# Altium footprint library IC.PcbLib: 68 footprints (part 1 of 5)
Each footprint in its own frame and in the unit in brackets; x right, y up, seen from the top. Pads: shape width x height; smd on the part's side, far side on the other; paste and mask are expansions set on the pad; w line width, h text height; cw(c..) or ccw(c..) is an arc to the next point about the centre after c.
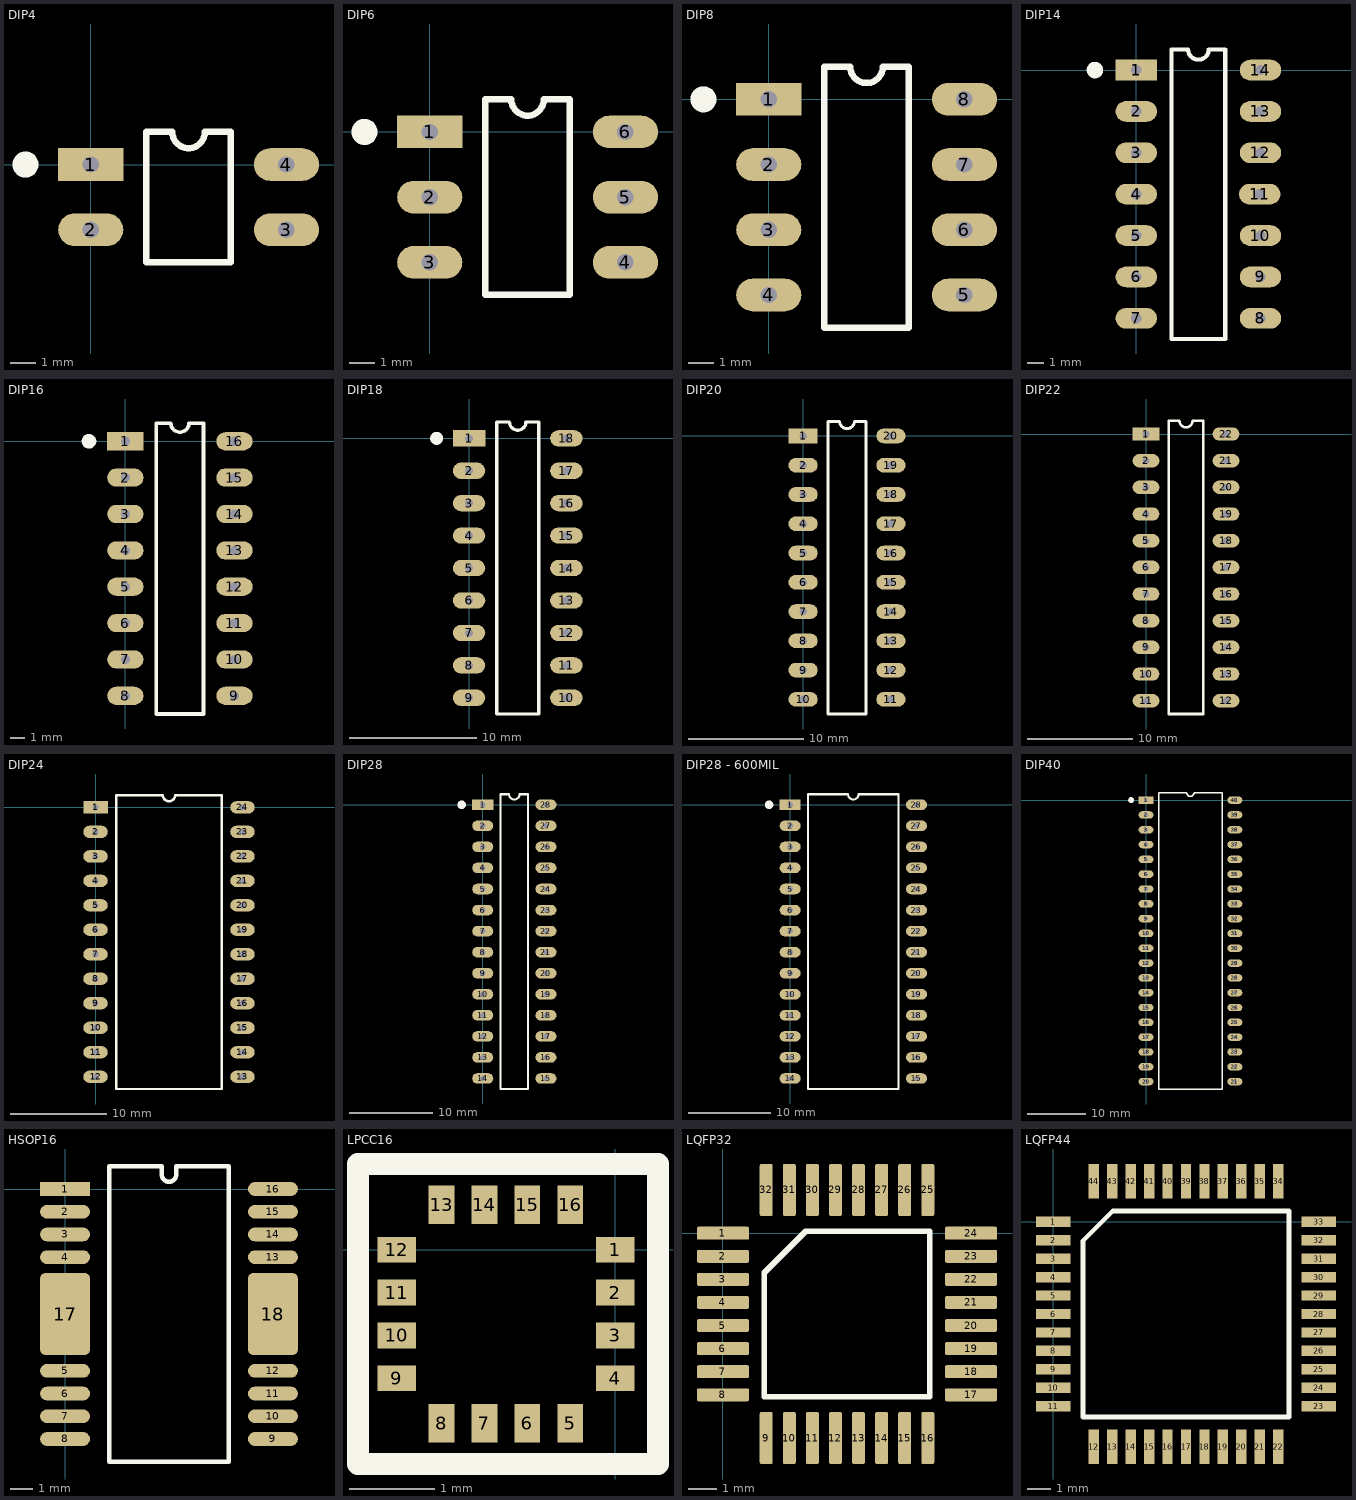
[diagram p0: the footprints below, top view; thin cyan lines are the x and y axes]

## DIP4 [mm]
pads (4):
  rect 2.54x1.27 hole 0.635: 1(0,0)
  oval 2.54x1.27 hole 0.635: 2(0,-2.54) 3(7.62,-2.54) 4(7.62,0)
Top Overlay:
  circle w0.508: c-2.54,0 r0.254
  lines w0.254: 2.159,-3.81 2.159,1.27 3.175,1.27 ccw(c3.81,1.27) 4.445,1.27 5.461,1.27 5.461,-3.81 2.159,-3.81
3D body "CircuitWorks-DIP4.step": height 4.31, standoff -3.28, extent 0,-4.04 8,1.5

## DIP6 [mm]
pads (6):
  rect 2.54x1.27 hole 0.635: 1(0,0)
  oval 2.54x1.27 hole 0.635: 2(0,-2.54) 3(0,-5.08) 4(7.62,-5.08) 5(7.62,-2.54) 6(7.62,0)
Top Overlay:
  circle w0.508: c-2.54,0 r0.254
  lines w0.254: 2.159,-6.35 5.461,-6.35 5.461,1.27 4.445,1.27 cw(c3.81,1.27) 3.175,1.27 2.159,1.27 2.159,-6.35
3D body "User Library-DIP06-300.step": height 5.3, standoff -2.49, extent -0.13,-6.94 7.75,1.86

## DIP8 [mm]
pads (8):
  rect 2.54x1.27 hole 0.635: 1(0,0)
  oval 2.54x1.27 hole 0.635: 2(0,-2.54) 3(0,-5.08) 4(0,-7.62) 5(7.62,-7.62) 6(7.62,-5.08) 7(7.62,-2.54) 8(7.62,0)
Top Overlay:
  circle w0.508: c-2.54,0 r0.254
  lines w0.254: 2.159,-8.89 5.461,-8.89 5.461,1.27 4.445,1.27 cw(c3.81,1.27) 3.175,1.27 2.159,1.27 2.159,-8.89
3D body "User Library-DIP08-300.step": height 5.08, standoff -2.49, extent -0.125,-9.27 7.745,1.65

## DIP14 [mil]
pads (14):
  rect 100x50 hole 25: 1(0,0)
  oval 100x50 hole 25: 2(0,-100) 3(0,-200) 4(0,-300) 5(0,-400) 6(0,-500) 7(0,-600) 8(300,-600) 9(300,-500) 10(300,-400) 11(298,-300) 12(300,-200) 13(300,-100) 14(300,0)
Top Overlay:
  circle w20: c-100,0 r10
  lines w10: 85,-650 215,-650 215,50 175,50 cw(c150,50) 125,50 85,50 85,-650
3D body "User Library-DIP14-300.step": height 200, standoff -98.03, extent -11.84,-683.86 298,83.86

## DIP16 [mm] "DIP; 16 Leads; Row Spacing 7.62mm; Pitch 2.54mm"
pads (16):
  rect 2.54x1.27 hole 0.635: 1(0,0)
  oval 2.54x1.27 hole 0.635: 2(0,-2.54) 3(0,-5.08) 4(0,-7.62) 5(0,-10.16) 6(0,-12.7) 7(0,-15.24) 8(0,-17.78) 9(7.62,-17.78) 10(7.62,-15.24) 11(7.62,-12.7) 12(7.62,-10.16) 13(7.62,-7.62) 14(7.62,-5.08) 15(7.62,-2.54) 16(7.62,0)
Top Overlay:
  circle w0.508: c-2.54,0 r0.254
  lines w0.254: 2.159,-19.05 5.461,-19.05 5.461,1.27 4.445,1.27 cw(c3.81,1.27) 3.175,1.27 2.159,1.27 2.159,-19.05
3D body "User Library-DIP16-300.step": height 5.08, standoff -2.49, extent -0.125,-18.89 7.745,1.11

## DIP18 [mm]
pads (18):
  rect 2.54x1.27 hole 0.635: 1(0,0)
  oval 2.54x1.27 hole 0.635: 2(0,-2.54) 3(0,-5.08) 4(0,-7.62) 5(0,-10.16) 6(0,-12.7) 7(0,-15.24) 8(0,-17.78) 9(0,-20.32) 10(7.62,-20.32) 11(7.62,-17.78) 12(7.62,-15.24) 13(7.62,-12.7) 14(7.62,-10.16) 15(7.62,-7.62) 16(7.62,-5.08) 17(7.62,-2.54) 18(7.62,0)
Top Overlay:
  circle w0.508: c-2.54,0 r0.254
  lines w0.254: 2.159,-21.59 2.159,1.27 3.175,1.27 ccw(c3.81,1.27) 4.445,1.27 5.461,1.27 5.461,-21.59 2.159,-21.59
3D body "User Library-DIP18-300.step": height 5.08, standoff -2.49, extent -0.125,-21.72 7.745,1.27

## DIP20 [mm]
pads (20):
  rect 2.54x1.27 hole 0.635: 1(0,0)
  oval 2.54x1.27 hole 0.635: 2(0,-2.54) 3(0,-5.08) 4(0,-7.62) 5(0,-10.16) 6(0,-12.7) 7(0,-15.24) 8(0,-17.78) 9(0,-20.32) 10(0,-22.86) 11(7.62,-22.86) 12(7.62,-20.32) 13(7.62,-17.78) 14(7.62,-15.24) 15(7.62,-12.7) 16(7.62,-10.16) 17(7.62,-7.62) 18(7.62,-5.08) 19(7.62,-2.54) 20(7.62,0)
Top Overlay:
  lines w0.254: 2.159,-24.13 2.159,1.27 3.175,1.27 ccw(c3.81,1.27) 4.445,1.27 5.461,1.27 5.461,-24.13 2.159,-24.13
3D body "User Library-DIP20.STEP": height 4.57, standoff -3.81, extent -0.1,-24.7 7.72,1.84

## DIP22 [mm]
pads (22):
  rect 2.54x1.27 hole 0.635: 1(0,0)
  oval 2.54x1.27 hole 0.635: 2(0,-2.54) 3(0,-5.08) 4(0,-7.62) 5(0,-10.16) 6(0,-12.7) 7(0,-15.24) 8(0,-17.78) 9(0,-20.32) 10(0,-22.86) 11(0,-25.4) 12(7.62,-25.4) 13(7.62,-22.86) 14(7.62,-20.32) 15(7.62,-17.78) 16(7.62,-15.24) 17(7.62,-12.7) 18(7.62,-10.16) 19(7.62,-7.62) 20(7.62,-5.08) 21(7.62,-2.54) 22(7.62,0)
Top Overlay:
  lines w0.254: 2.159,-26.67 2.159,1.27 3.175,1.27 ccw(c3.81,1.27) 4.445,1.27 5.461,1.27 5.461,-26.67 2.159,-26.67
3D body "User Library-DIP22P3.STEP": height 5.09, standoff -2.48, extent -0.125,-27.53 7.745,2.13

## DIP24 [mm]
pads (24):
  rect 2.54x1.27 hole 0.635: 1(0,0)
  oval 2.54x1.27 hole 0.635: 2(0,-2.54) 3(0,-5.08) 4(0,-7.62) 5(0,-10.16) 6(0,-12.7) 7(0,-15.24) 8(0,-17.78) 9(0,-20.32) 10(0,-22.86) 11(0,-25.4) 12(0,-27.94) 13(15.24,-27.94) 14(15.24,-25.4) 15(15.24,-22.86) 16(15.24,-20.32) 17(15.24,-17.78) 18(15.24,-15.24) 19(15.24,-12.7) 20(15.24,-10.16) 21(15.24,-7.62) 22(15.24,-5.08) 23(15.24,-2.54) 24(15.24,0)
Top Overlay:
  lines w0.254: 2.159,-29.21 13.081,-29.21 13.081,1.27 8.255,1.27 cw(c7.62,1.27) 6.985,1.27 2.159,1.27 2.159,-29.21
3D body "User Library-DIP24-600.step": height 5.7, standoff -2.58, extent -0.125,-30.1 15.365,2.16

## DIP28 [mm]
pads (28):
  rect 2.54x1.27 hole 0.635: 1(0,0)
  oval 2.54x1.27 hole 0.635: 2(0,-2.54) 3(0,-5.08) 4(0,-7.62) 5(0,-10.16) 6(0,-12.7) 7(0,-15.24) 8(0,-17.78) 9(0,-20.32) 10(0,-22.86) 11(0,-25.4) 12(0,-27.94) 13(0,-30.48) 14(0,-33.02) 15(7.62,-33.02) 16(7.62,-30.48) 17(7.62,-27.94) 18(7.62,-25.4) 19(7.62,-22.86) 20(7.62,-20.32) 21(7.62,-17.78) 22(7.62,-15.24) 23(7.62,-12.7) 24(7.62,-10.16) 25(7.62,-7.62) 26(7.62,-5.08) 27(7.62,-2.54) 28(7.62,0)
Top Overlay:
  circle w0.508: c-2.54,0 r0.254
  lines w0.254: 2.159,-34.29 5.461,-34.29 5.461,1.27 4.445,1.27 cw(c3.81,1.27) 3.175,1.27 2.159,1.27 2.159,-34.29
3D body "User Library-DIP28-300 (1).step": height 5.08, standoff -2.49, extent -0.125,-34.51 7.745,1.49

## DIP28 - 600MIL [mm]
pads (28):
  rect 2.54x1.27 hole 0.635: 1(0,0)
  oval 2.54x1.27 hole 0.635: 2(0,-2.54) 3(0,-5.08) 4(0,-7.62) 5(0,-10.16) 6(0,-12.7) 7(0,-15.24) 8(0,-17.78) 9(0,-20.32) 10(0,-22.86) 11(0,-25.4) 12(0,-27.94) 13(0,-30.48) 14(0,-33.02) 15(15.24,-33.02) 16(15.24,-30.48) 17(15.24,-27.94) 18(15.24,-25.4) 19(15.24,-22.86) 20(15.24,-20.32) 21(15.24,-17.78) 22(15.24,-15.24) 23(15.24,-12.7) 24(15.24,-10.16) 25(15.24,-7.62) 26(15.24,-5.08) 27(15.24,-2.54) 28(15.24,0)
Top Overlay:
  circle w0.508: c-2.54,0 r0.254
  lines w0.254: 13.056,1.27 8.255,1.27 cw(c7.62,1.27) 6.985,1.27 2.159,1.27 2.159,-34.29 13.081,-34.29 13.081,1.295
3D body "User Library-DIP28-600.step": height 5.7, standoff -2.58, extent -0.125,-35.16 15.365,2.14

## DIP40 [mm]
pads (40):
  rect 2.54x1.27 hole 0.635: 1(0,0)
  oval 2.54x1.27 hole 0.635: 2(0,-2.54) 3(0,-5.08) 4(0,-7.62) 5(0,-10.16) 6(0,-12.7) 7(0,-15.24) 8(0,-17.78) 9(0,-20.32) 10(0,-22.86) 11(0,-25.4) 12(0,-27.94) 13(0,-30.48) 14(0,-33.02) 15(0,-35.56) 16(0,-38.1) 17(0,-40.64) 18(0,-43.18) 19(0,-45.72) 20(0,-48.26) 21(15.24,-48.26) 22(15.24,-45.72) 23(15.24,-43.18) 24(15.24,-40.64) 25(15.24,-38.1) 26(15.24,-35.56) 27(15.24,-33.02) 28(15.24,-30.48) 29(15.24,-27.94) 30(15.24,-25.4) 31(15.24,-22.86) 32(15.24,-20.32) 33(15.24,-17.78) 34(15.24,-15.24) 35(15.24,-12.7) 36(15.24,-10.16) 37(15.24,-7.62) 38(15.24,-5.08) 39(15.24,-2.54) 40(15.24,0)
Top Overlay:
  circle w0.508: c-2.54,0 r0.254
  lines w0.254: 2.159,-49.53 2.159,1.27 6.985,1.27 ccw(c7.62,1.27) 8.255,1.27 13.081,1.27 13.081,-49.53 2.159,-49.53
3D body "User Library-DIP40-600.step": height 5.7, standoff -2.58, extent -0.152,-50.368 15.338,2.082

## HSOP16 [mm]
pads (18):
  rect 2.2x0.6 smd: 1(0,0)
  oval 2.2x0.6 smd: 2(0,-1) 3(0,-2) 4(0,-3) 5(0,-8) 6(0,-9) 7(0,-10) 8(0,-11) 9(9.144,-11) 10(9.144,-10) 11(9.144,-9) 12(9.144,-8) 13(9.144,-3) 14(9.144,-2) 15(9.144,-1) 16(9.144,0)
  rrect20% 2.2x3.6 smd: 17(0,-5.5) 18(9.144,-5.5)
Top Overlay:
  lines w0.2: 1.935,-12 1.935,1 4.255,1 4.255,0.635 ccw(c4.572,0.635) 4.889,0.635 4.889,1 7.209,1 7.209,-12 1.935,-12
3D body "User Library-HSOP16-TB6569FG.step": height 2.4, standoff 0, extent -0.3,-12 9.3,1

## LPCC16 [mm]
pads (16):
  rect 0.45x0.3 smd: 1(0,0) 2(0,-0.5) 3(0,-1) 4(0,-1.5) 9(-2.55,-1.5) 10(-2.55,-1) 11(-2.55,-0.5) 12(-2.55,0)
  rect 0.3x0.45 smd: 5(-0.525,-2.025) 6(-1.025,-2.025) 7(-1.525,-2.025) 8(-2.025,-2.025) 13(-2.025,0.525) 14(-1.525,0.525) 15(-1.025,0.525) 16(-0.525,0.525)
Top Overlay:
  lines w0.254: -3,-2.5 0.5,-2.5 0.5,1 -3,1 -3,-2.5

## LQFP32 [mm]
pads (32):
  rrect25% 1.8x0.45 smd: 1(0,0) 2(0,-0.8) 3(0,-1.6) 4(0,-2.4) 5(0,-3.2) 6(0,-4) 7(0,-4.8) 8(0,-5.6) 17(8.6,-5.6) 18(8.6,-4.8) 19(8.6,-4) 20(8.6,-3.2) 21(8.6,-2.4) 22(8.6,-1.6) 23(8.6,-0.8) 24(8.6,0)
  rrect25% 0.45x1.8 smd: 9(1.5,-7.1) 10(2.3,-7.1) 11(3.1,-7.1) 12(3.9,-7.1) 13(4.7,-7.1) 14(5.5,-7.1) 15(6.3,-7.1) 16(7.1,-7.1) 25(7.1,1.5) 26(6.3,1.5) 27(5.5,1.5) 28(4.7,1.5) 29(3.9,1.5) 30(3.1,1.5) 31(2.3,1.5) 32(1.5,1.5)
Top Overlay:
  lines w0.2: 1.435,-5.665 7.165,-5.665 7.165,0.065 2.87,0.065 1.435,-1.37 1.435,-5.665
3D body "User Library-TQFP32-2.step": height 0.95, standoff -0.05, extent -0.207,-7.294 8.793,1.706

## LQFP44 [mm] "10*10*1.4"
height 1.4
pads (44):
  rect 1.5x0.45 smd: 1(0,0) 2(0,-0.8) 3(0,-1.6) 4(0,-2.4) 5(0,-3.2) 6(0,-4) 7(0,-4.8) 8(0,-5.6) 9(0,-6.4) 10(0,-7.2) 11(0,-8) 23(11.5,-8) 24(11.5,-7.2) 25(11.5,-6.4) 26(11.5,-5.6) 27(11.5,-4.8) 28(11.5,-4) 29(11.5,-3.2) 30(11.5,-2.4) 31(11.5,-1.6) 32(11.5,-0.8) 33(11.5,0)
  rect 0.45x1.5 smd: 12(1.75,-9.75) 13(2.55,-9.75) 14(3.35,-9.75) 15(4.15,-9.75) 16(4.95,-9.75) 17(5.75,-9.75) 18(6.55,-9.75) 19(7.35,-9.75) 20(8.15,-9.75) 21(8.95,-9.75) 22(9.75,-9.75) 34(9.75,1.75) 35(8.95,1.75) 36(8.15,1.75) 37(7.35,1.75) 38(6.55,1.75) 39(5.75,1.75) 40(4.95,1.75) 41(4.15,1.75) 42(3.35,1.75) 43(2.55,1.75) 44(1.75,1.75)
Top Overlay:
  lines w0.2: 1.285,-8.465 1.285,-0.82 2.57,0.465 10.215,0.465 10.215,-8.465 1.285,-8.465
3D body "IC-LQFP44.STEP": height 1.6, standoff 0, extent -0.361,-10.092 11.842,2.108